# Altium integrated library AnalogDevices.IntLib: 130 symbols (part 1 of 4)
Pins are listed as number, name and electrical type; pins without a type are passive.

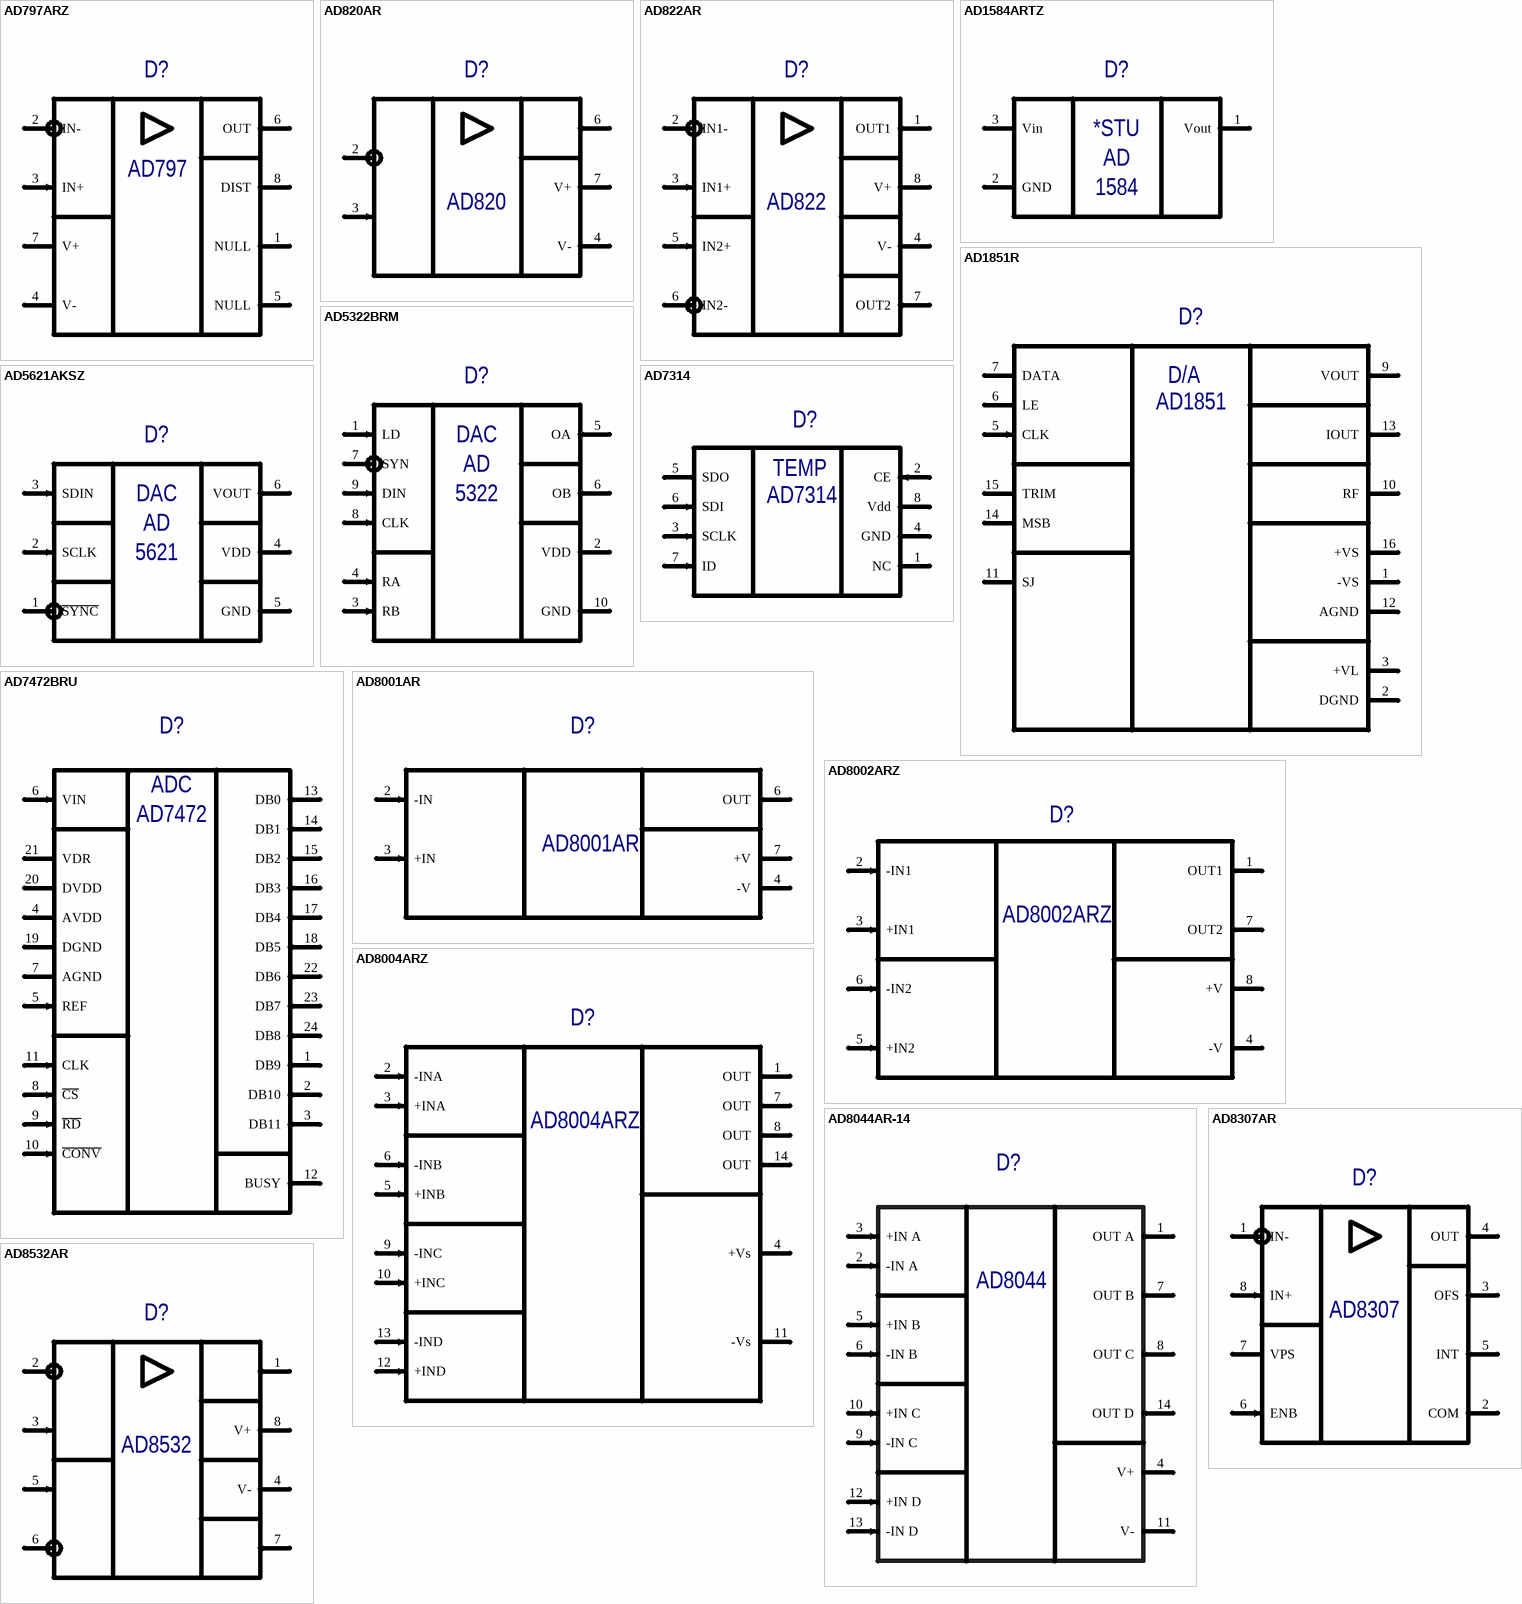
[diagram p0: symbols AD797ARZ to AD8532AR]

## AD797ARZ
designator D?  (value not drawn)
Ultralow Noise Op Amp; Manufacturer: Analog Devices; Type: Микросхема; BCPId: *; Name: *; Package: R-8; ManufacturerPartNumber: AD797ARZ
footprint SOIC127P600-8M (SOIC, 8-Leads, Body 4.9x3.9mm, Pitch 1.27mm, IPC Low Density)
pins: 1 NULL (power) "OFFSET NULL", 2 IN- (in) "IN1-", 3 IN+ (in) "IN1+", 4 V- (power) "0V power pin", 5 NULL (power) "OFFSET NULL", 6 OUT (out) "OUT2", 7 V+ (power) "5 V to 30 V power pin", 8 DIST (power) "OFFSET NULL"
text: AD797

## AD820AR
designator D?  (value not drawn)
Single Supply, Rail-to-Rail Low Power FET-Input Op Amp; Manufacturer: Analog Devices; Type: Микросхема; SymAuthor: Ерешко П.А.; BCPId: *; Name: *; Package: R-8; ManufacturerPartNumber: AD820AR
footprint SOIC127P600-8M (SOIC, 8-Leads, Body 4.9x3.9mm, Pitch 1.27mm, IPC Low Density)
pins: 2 IN- (in), 3 IN+ (in), 4 V- (power) "0V power pin", 6 OUT (out), 7 V+ (power) "5 V to 30 V power pin"
text: AD820

## AD822AR
designator D?  (value not drawn)
Single Supply, Rail-to-Rail Low Power FET-Input Op Amp; Manufacturer: Analog Devices; Type: Микросхема; BCPId: *; Name: *; Package: R-8; ManufacturerPartNumber: AD822AR
footprint SOIC127P600-8M (SOIC, 8-Leads, Body 4.9x3.9mm, Pitch 1.27mm, IPC Low Density)
pins: 1 OUT1 (out), 2 IN1- (in), 3 IN1+ (in), 4 V- (power) "0V power pin", 5 IN2+ (in), 6 IN2- (in), 7 OUT2 (out), 8 V+ (power) "5 V to 30 V power pin"
text: AD822

## AD1584ARTZ
designator D?  (value not drawn)
4.096 V Micropower, Precision Series Mode Voltage Reference; Manufacturer: Analog Devices; Type: Микросхема; BCPId: *; Name: *; Package: SOT-23-3; ManufacturerPartNumber: AD1584ARTZ
footprint SOT23-3L (SOT23, 3-Leads, Body 2.9x1.3mm, Pitch 0.95mm, Lead Span 2.5mm, IPC High Density)
footprint SOT23-3M (SOT23, 3-Leads, Body 2.9x1.3mm, Pitch 0.95mm, Lead Span 2.5mm, IPC Low Density)
footprint SOT23-3N (SOT23, 3-Leads, Body 2.9x1.3mm, Pitch 0.95mm, Lead Span 2.5mm, IPC Medium Density)
pins: 1 Vout (power) "Output", 2 GND (power) "Ground", 3 Vin (power) "Input"
text: *STU; AD; 1584

## AD1851R
designator D?  (value not drawn)
16-Bit DAC; Manufacturer: Analog Devices; Type: Микросхема; BCPId: *; Name: *; Package: R-16 (16-pin SOIC); ManufacturerPartNumber: AD1851R
footprint SOIC127P1030X265-16N (SOIC, 16-Leads, Body 10,30x7,50mm, Pitch 1,27mm, IPC Medium Density)
pins: 1 -VS (power) "Analog Negative Power Supply", 2 DGND (power) "Logic Ground", 3 +VL (power) "Logic Positive Power Supply", 4 NC hidden, 5 CLK (in) "Clock Input", 6 LE "Latch Enable Input", 7 DATA "Serial Data Input", 8 NC hidden, 9 VOUT (out) "Voltage Output", 10 RF "Feedback Resistor", 11 SJ "Summing Junction", 12 AGND (power) "Analog Ground", 13 IOUT (out) "Current Output", 14 MSB "MSB Adjustment Terminal", 15 TRIM "MSB Trimming Potentiometer Terminal", 16 +VS (power) "Analog Positive Power Supply"
text: D/A; AD1851

## AD5322BRM
designator D?  (value not drawn)
12-Bit DAC; Manufacturer: Analog Devices; Type: Микросхема; BCPId: *; Name: *; Package: RM-10; ManufacturerPartNumber: AD5322BRM
footprint TSSOP50P490X110-10N (TSSOP, 10-Leads, Body 3,0x3,0mm (max), Pitch 0,50mm, IPC Medium Density)
pins: 1 LD (in) "Active Low Control Input.", 2 VDD (power) "Power Supply Input from 2.5 V to 5.5 V", 3 RB (in) "Reference Input Pin for DAC B", 4 RA (in) "Reference Input Pin for DAC A", 5 OA (out) "Buffered Analog Output Voltage from DAC A", 6 OB (out) "Buffered Analog Output Voltage from DAC B", 7 SYN (in) "Active Low Control Input", 8 CLK (in) "Serial Clock Input", 9 DIN (in) "Serial Data Input", 10 GND (power) "Ground Reference Point for All Circuitry on the Part"
text: DAC; AD; 5322

## AD5621AKSZ
designator D?  (value not drawn)
12-Bit DAC; Manufacturer: Analog Devices; Type: Микросхема; SymAuthor: Ерешко П.А.; BCPId: *; Name: *; Package: KS-6; ManufacturerPartNumber: AD5621AKSZ
footprint SC70-6 (6-Lead Plastic SC70)
pins: 1 ~{SYNС} (in) "Active Low Control Input", 2 SCLK (in) "Serial Clock Input", 3 SDIN (in) "Serial Data Input", 4 VDD (power) "Power Supply Input from 2.7 V to 5.5 V", 5 GND (power) "Ground", 6 VOUT (out) "Analog Output Voltage from the DAC"
text: DAC; AD; 5621

## AD7314
designator D?  (value not drawn)
Low Voltage, 10-Bit Digital Temperature  Sensor in 8-Lead MSOP; Manufacturer: Analog Devices; ManufacturerPartNumber: AD7314ARMZ; Type: Микросхема; SymAuthor: Календарова В.; BCPId: *; Package: RM-8; TU/GOST: *
footprint TSOP65P490X110-8N (Shrink Small Outline; 8 Leads; Body Width 3 mm; Pitch 0.65 mm)
pins: 1 NC, 2 CE (in), 3 SCLK (in), 4 GND (power), 5 SDO (out), 6 SDI (in), 7 ID (in), 8 Vdd (power)
text: TEMP

## AD7472BRU
designator D?  (value not drawn)
АЦП одноканальный разрядностью 12 бит с параллельным интерфейсом; Manufacturer: Analog Devices; Type: Микросхема; SymAuthor: Семенов В.С.; BCPId: *; ManufacturerPartNumber: AD7472BRU; Package: RU-24
footprint TSOP65P640X120-24N (TSOP, 24-Leads, Body 6,6x4,5mm (max), Pitch 0,65mm, IPC Medium Density)
pins: 1 DB9 (out) "Цифровой выход параллельного интерфейса", 2 DB10 (out) "Цифровой выход параллельного интерфейса", 3 DB11 (out) "Цифровой выход параллельного интерфейса", 4 AVDD (power) "Вход питания аналоговых цепей", 5 REF (in) "Вход для внешнего опорного напряжения", 6 VIN (in) "Аналоговый вход для измеряемого напряжения", 7 AGND (power) "Земля аналоговых цепей", 8 ~{CS} (in) "Инверсный вход, выбор чипа", 9 ~{RD} (in) "Инверсный вход выбора режима чтения", 10 ~{CONV} (in) "Инверсный вход сигнала запуска преобразования", 11 CLK (in) "Вход тактирования параллельного интерфейса", 12 BUSY (out) "Цифровой выход сигнала индикации состояния микросхемы", 13 DB0 (out) "Цифровой выход параллельного интерфейса", 14 DB1 (out) "Цифровой выход параллельного интерфейса", 15 DB2 (out) "Цифровой выход параллельного интерфейса", 16 DB3 (out) "Цифровой выход параллельного интерфейса", 17 DB4 (out) "Цифровой выход параллельного интерфейса", 18 DB5 (out) "Цифровой выход параллельного интерфейса", 19 DGND (power) "Земля цифровых цепей", 20 DVDD (power) "Вход питания цифровых цепей", 21 VDR (power) "Вход питания драйверов цепей параллельного интерфейса", 22 DB6 (out) "Цифровой выход параллельного интерфейса", 23 DB7 (out) "Цифровой выход параллельного интерфейса", 24 DB8 (out) "Цифровой выход параллельного интерфейса"
text: ADC; AD7472

## AD8001AR
designator D?  (value not drawn)
800 MHz, 50 mW  Current Feedback Amplifier; Manufacturer: Analog Devices; Type: Микросхема; BCPId: *; ManufacturerPartNumber: AD8001AR; Package: R-8 (8-Lead SOIC)
footprint SOIC127P600-8M (SOIC, 8-Leads, Body 4.9x3.9mm, Pitch 1.27mm, IPC Low Density)
pins: 1 NC hidden, 2 -IN (in), 3 +IN (in), 4 -V (power), 5 NC hidden, 6 OUT (out), 7 +V (power), 8 NC hidden

## AD8002ARZ
designator D?
Dual 600 MHz, 50 mW  Current Feedback Amplifier; Manufacturer: Analog Devices; ManufacturerPartNumber: AD8002ARZ; Type: Микросхема; BCPId: *; Package: R-8 (8-Lead SOIC)
footprint SOIC127P600-8M (SOIC, 8-Leads, Body 4.9x3.9mm, Pitch 1.27mm, IPC Low Density)
pins: 1 OUT1 (out) "Output 1", 2 -IN1 (in) "Inverting Input 1", 3 +IN1 (in) "Noninverting Input 1", 4 -V (power) "VEE or Negative Supply", 5 +IN2 (in) "Noninverting Input 2", 6 -IN2 (in) "Inverting Input 2", 7 OUT2 (out) "Output 2", 8 +V (power) "VCC or Positive Supply"

## AD8004ARZ
designator D?, comment AD8004ARZ-14  (value not drawn)
Quad 3000 V/ms, 35 mW  Current Feedback Amplifier; Manufacturer: Analog Devices; Type: Микросхема; BCPId: *; Name: *; Package: R-14; ManufacturerPartNumber: AD8004ARZ-14
footprint SOIC127P600X175-14N (SOIC, 14-Leads, Body 8.7x3.9mm, Pitch 1.27mm, IPC Medium Density)
pins: 1 OUT (out), 2 -INA (in), 3 +INA (in), 4 +Vs (power), 5 +INB (in), 6 -INB (in), 7 OUT (out), 8 OUT (out), 9 -INC (in), 10 +INC (in), 11 -Vs (power), 12 +IND (in), 13 -IND (in), 14 OUT (out)

## AD8044AR-14
designator D?
Quad 150 MHz  Rail-to-Rail Amplifier; Manufacturer: Analog Devices; ManufacturerPartNumber: AD8044AR-14; Type: Микросхема; BCPId: *; Package: R-14
footprint SOIC127P600X175-14N (SOIC, 14-Leads, Body 8.7x3.9mm, Pitch 1.27mm, IPC Medium Density)
pins: 1 OUT A (out) "Output A channel", 2 -IN A (in) "Input A channel", 3 +IN A (in) "Input A channel", 4 V+ (power) "Power", 5 +IN B (in) "Input B channel", 6 -IN B (in) "Input B channel", 7 OUT B (out) "Output B channel", 8 OUT C (out) "Output C channel", 9 -IN C (in) "Input C channel", 10 +IN C (in) "Itput C channel", 11 V- (power) "Power", 12 +IN D (in) "Input D channel", 13 -IN D (in) "Input D channel", 14 OUT D (out) "Output D channel"
text: AD8044

## AD8307AR
designator D?  (value not drawn)
Logarithmic Amplifier DC-500 MHz, 92 dB; Manufacturer: Analog Devices; Type: Микросхема; BCPId: *; Name: *; Package: SO-8; ManufacturerPartNumber: AD8307AR
footprint SOIC127P600-8M (SOIC, 8-Leads, Body 4.9x3.9mm, Pitch 1.27mm, IPC Low Density)
pins: 1 IN- (in), 2 COM (power) "Common Pin (Usually Grounded).", 3 OFS (out) "Offset Adjustment; External Capacitor  Connection", 4 OUT (out), 5 INT (out) "Intercept Adjustment", 6 ENB (in) "Chip Enable", 7 VPS (power) "Positive Supply, 2.7V–5.5V.", 8 IN+ (in)
text: AD8307

## AD8532AR
designator D?  (value not drawn)
Low Cost, 250 mA Output Single-Supply Amplifier; Manufacturer: Analog Devices; Type: Микросхема; BCPId: *; Name: *; Package: RN-8; ManufacturerPartNumber: AD8532AR
footprint SOIC127P600-8M (SOIC, 8-Leads, Body 4.9x3.9mm, Pitch 1.27mm, IPC Low Density)
pins: 1 OUTA (out), 2 INA- (in), 3 INA+ (in), 4 V- (power) "0V power pin", 5 INB+ (in), 6 INB- (in), 7 OUTB (out), 8 V+ (power) "+2.7-6.0 V power pin"
text: AD8532

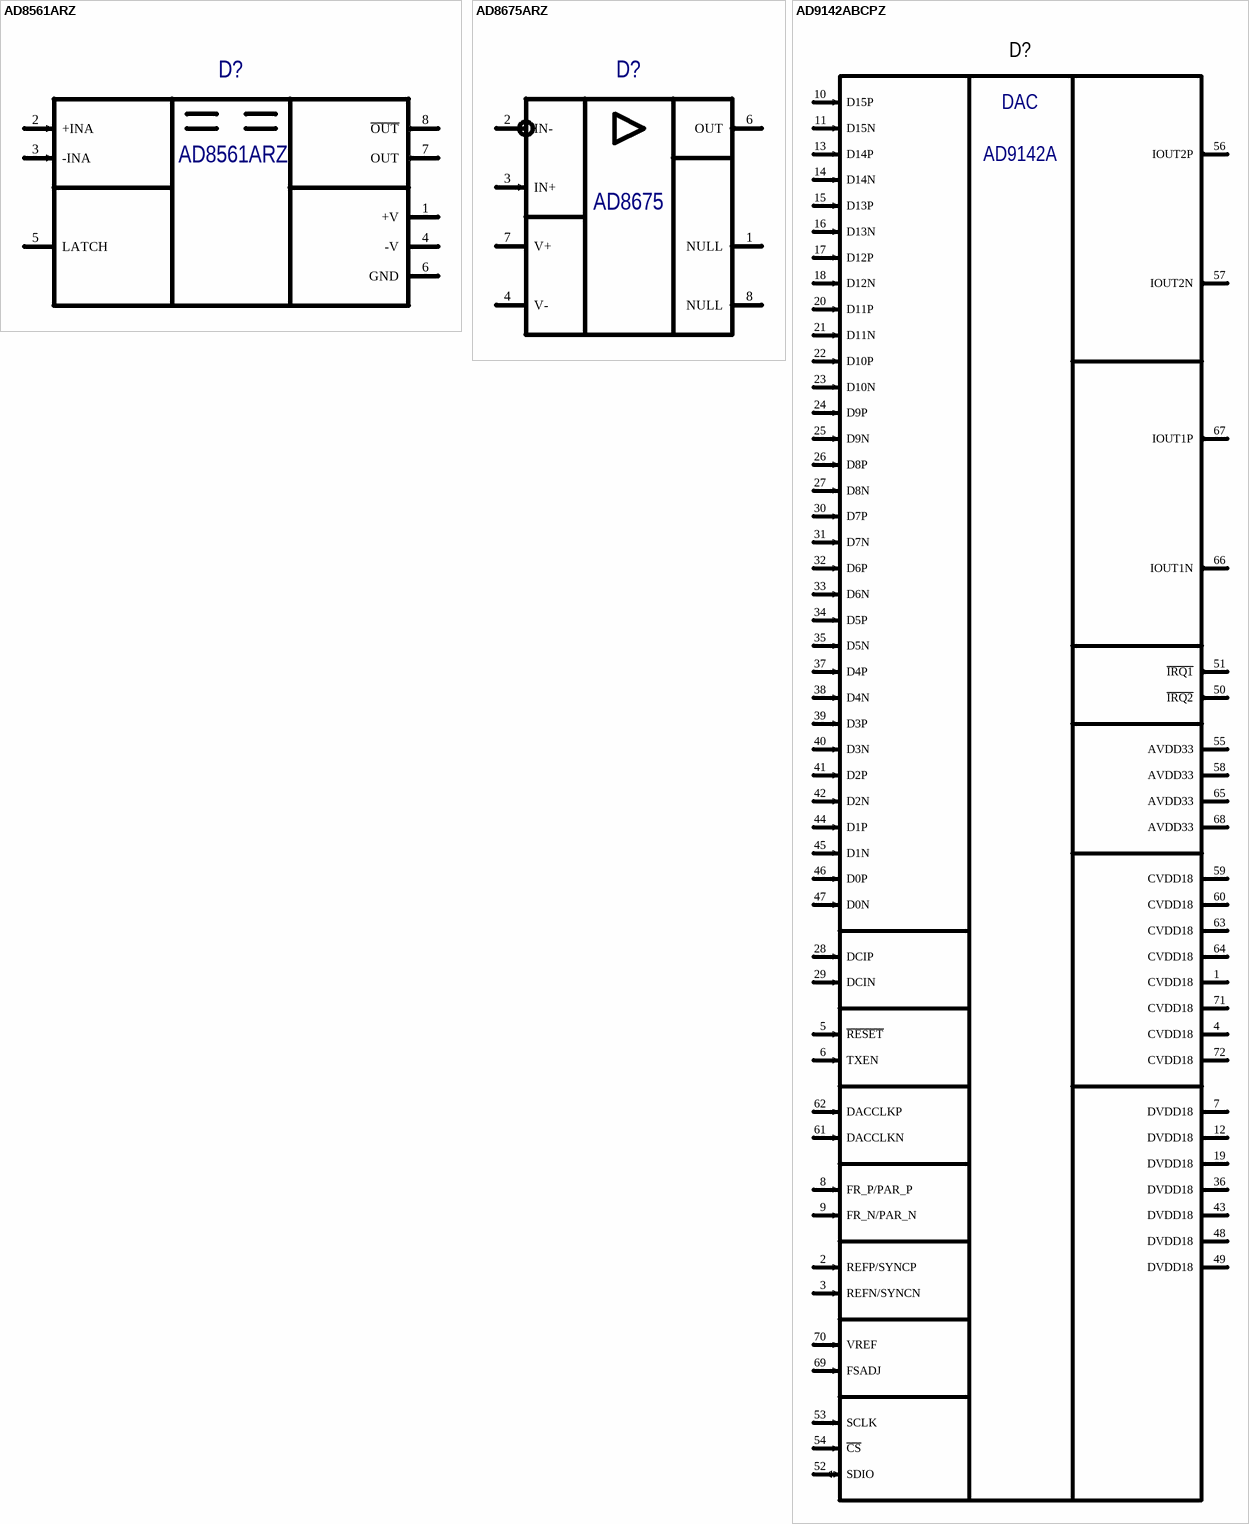
[diagram p1: symbols AD8561ARZ to AD9142ABCPZ]

## AD8561ARZ
designator D?  (value not drawn)
Ultrafast 7 ns  Single Supply Comparator; Manufacturer: Analog Devices; Type: Микросхема; BCPId: *; Name: *; Package: R-8; ManufacturerPartNumber: AD8561ARZ
footprint SOIC127P600-8M (SOIC, 8-Leads, Body 4.9x3.9mm, Pitch 1.27mm, IPC Low Density)
pins: 1 +V (power), 2 +INA (in), 3 -INA (in), 4 -V (power), 5 LATCH, 6 GND (power), 7 OUT (out), 8 ~{OUT} (out)

## AD8675ARZ
designator D?  (value not drawn)
36 V Precision, 2.8 nV/√Hz  Rail-to-Rail Output Op Amp; Manufacturer: Analog Devices; Type: Микросхема; BCPId: *; Name: *; Package: R-8; ManufacturerPartNumber: AD8675ARZ
footprint SOIC127P600-8M (SOIC, 8-Leads, Body 4.9x3.9mm, Pitch 1.27mm, IPC Low Density)
pins: 1 NULL (power) "OUT1", 2 IN- (in) "IN1-", 3 IN+ (in) "IN1+", 4 V- (power) "0V power pin", 6 OUT (out) "OUT2", 7 V+ (power) "5 V to 30 V power pin", 8 NULL (power) "5 V to 30 V power pin"
text: AD8675

## AD9142ABCPZ
designator D?  (value not drawn)
Dual, 16-Bit, 1600 MSPS, TxDAC+ Digital-to-Analog Converter; Manufacturer: Analog Devices; Type: Микросхема; SymAuthor: Семенов В.С.; ManufacturerPartNumber: AD9142ABCPZ; Package: CP-72-7
footprint QFN50P1000X1000X100_HS615-73N (QFN, 72-Leads, Body 10,00x10,00mm, Pitch 0,50mm, Thermal Pad 6,15x6,15mm, IPC Medium Density)
pins: 1 CVDD18 (power) "1.8 V Clock Supply. Supplies clock receivers and clock distribution", 2 REFP/SYNCP (in), 3 REFN/SYNCN (in), 4 CVDD18 (power) "1.8 V Clock Supply. Supplies clock receivers and clock distribution", 5 ~{RESET} (in), 6 TXEN (in), 7 DVDD18 (power) "1.8 V Digital Supply", 8 FR_P/PAR_P (in) "Frame/Parity Input", 9 FR_N/PAR_N (in) "Frame/Parity Input", 10 D15P (in) "Data input", 11 D15N (in) "Data input", 12 DVDD18 (power) "1.8 V Digital Supply", 13 D14P (in) "Data input", 14 D14N (in) "Data input", 15 D13P (in) "Data input", 16 D13N (in) "Data input", 17 D12P (in) "Data input", 18 D12N (in) "Data input", 19 DVDD18 (power) "1.8 V Digital Supply", 20 D11P (in) "Data input", 21 D11N (in) "Data input", 22 D10P (in) "Data input", 23 D10N (in) "Data input", 24 D9P (in) "Data input", 25 D9N (in) "Data input", 26 D8P (in) "Data input", 27 D8N (in) "Data input", 28 DCIP (in) "Data Clock Input", 29 DCIN (in) "Data Clock Input", 30 D7P (in) "Data input", 31 D7N (in) "Data input", 32 D6P (in) "Data input", 33 D6N (in) "Data input", 34 D5P (in) "Data input", 35 D5N (in) "Data input", 36 DVDD18 (power) "1.8 V Digital Supply", 37 D4P (in) "Data input", 38 D4N (in) "Data input", 39 D3P (in) "Data input", 40 D3N (in) "Data input", 41 D2P (in) "Data input", 42 D2N (in) "Data input", 43 DVDD18 (power) "1.8 V Digital Supply", 44 D1P (in) "Data input", 45 D1N (in) "Data input", 46 D0P (in) "Data input", 47 D0N (in) "Data input", 48 DVDD18 (power) "1.8 V Digital Supply", 49 DVDD18 (power) "1.8 V Digital Supply", 50 ~{IRQ2} (out), 51 ~{IRQ1} (out), 52 SDIO (io), 53 SCLK (in), 54 ~{CS} (in) "Serial Port Chip Select", 55 AVDD33 (power) "3.3 V Analog Supply", 56 IOUT2P (out), 57 IOUT2N (out), 58 AVDD33 (power) "3.3 V Analog Supply", 59 CVDD18 (power) "1.8 V Clock Supply. Supplies clock receivers and clock distribution", 60 CVDD18 (power) "1.8 V Clock Supply. Supplies clock receivers and clock distribution", 61 DACCLKN (in) "DAC Clock Input", 62 DACCLKP (in) "DAC Clock Input", 63 CVDD18 (power) "1.8 V Clock Supply. Supplies clock receivers and clock distribution", 64 CVDD18 (power) "1.8 V Clock Supply. Supplies clock receivers and clock distribution", 65 AVDD33 (power) "3.3 V Analog Supply", 66 IOUT1N (out), 67 IOUT1P (out), 68 AVDD33 (power) "3.3 V Analog Supply", 69 FSADJ (in), 70 VREF (in), 71 CVDD18 (power) "1.8 V Clock Supply. Supplies clock receivers and clock distribution", 72 CVDD18 (power) "1.8 V Clock Supply. Supplies clock receivers and clock distribution", EPAD (power) hidden to GND "Exposed Pad"
text: DAC; AD9142A

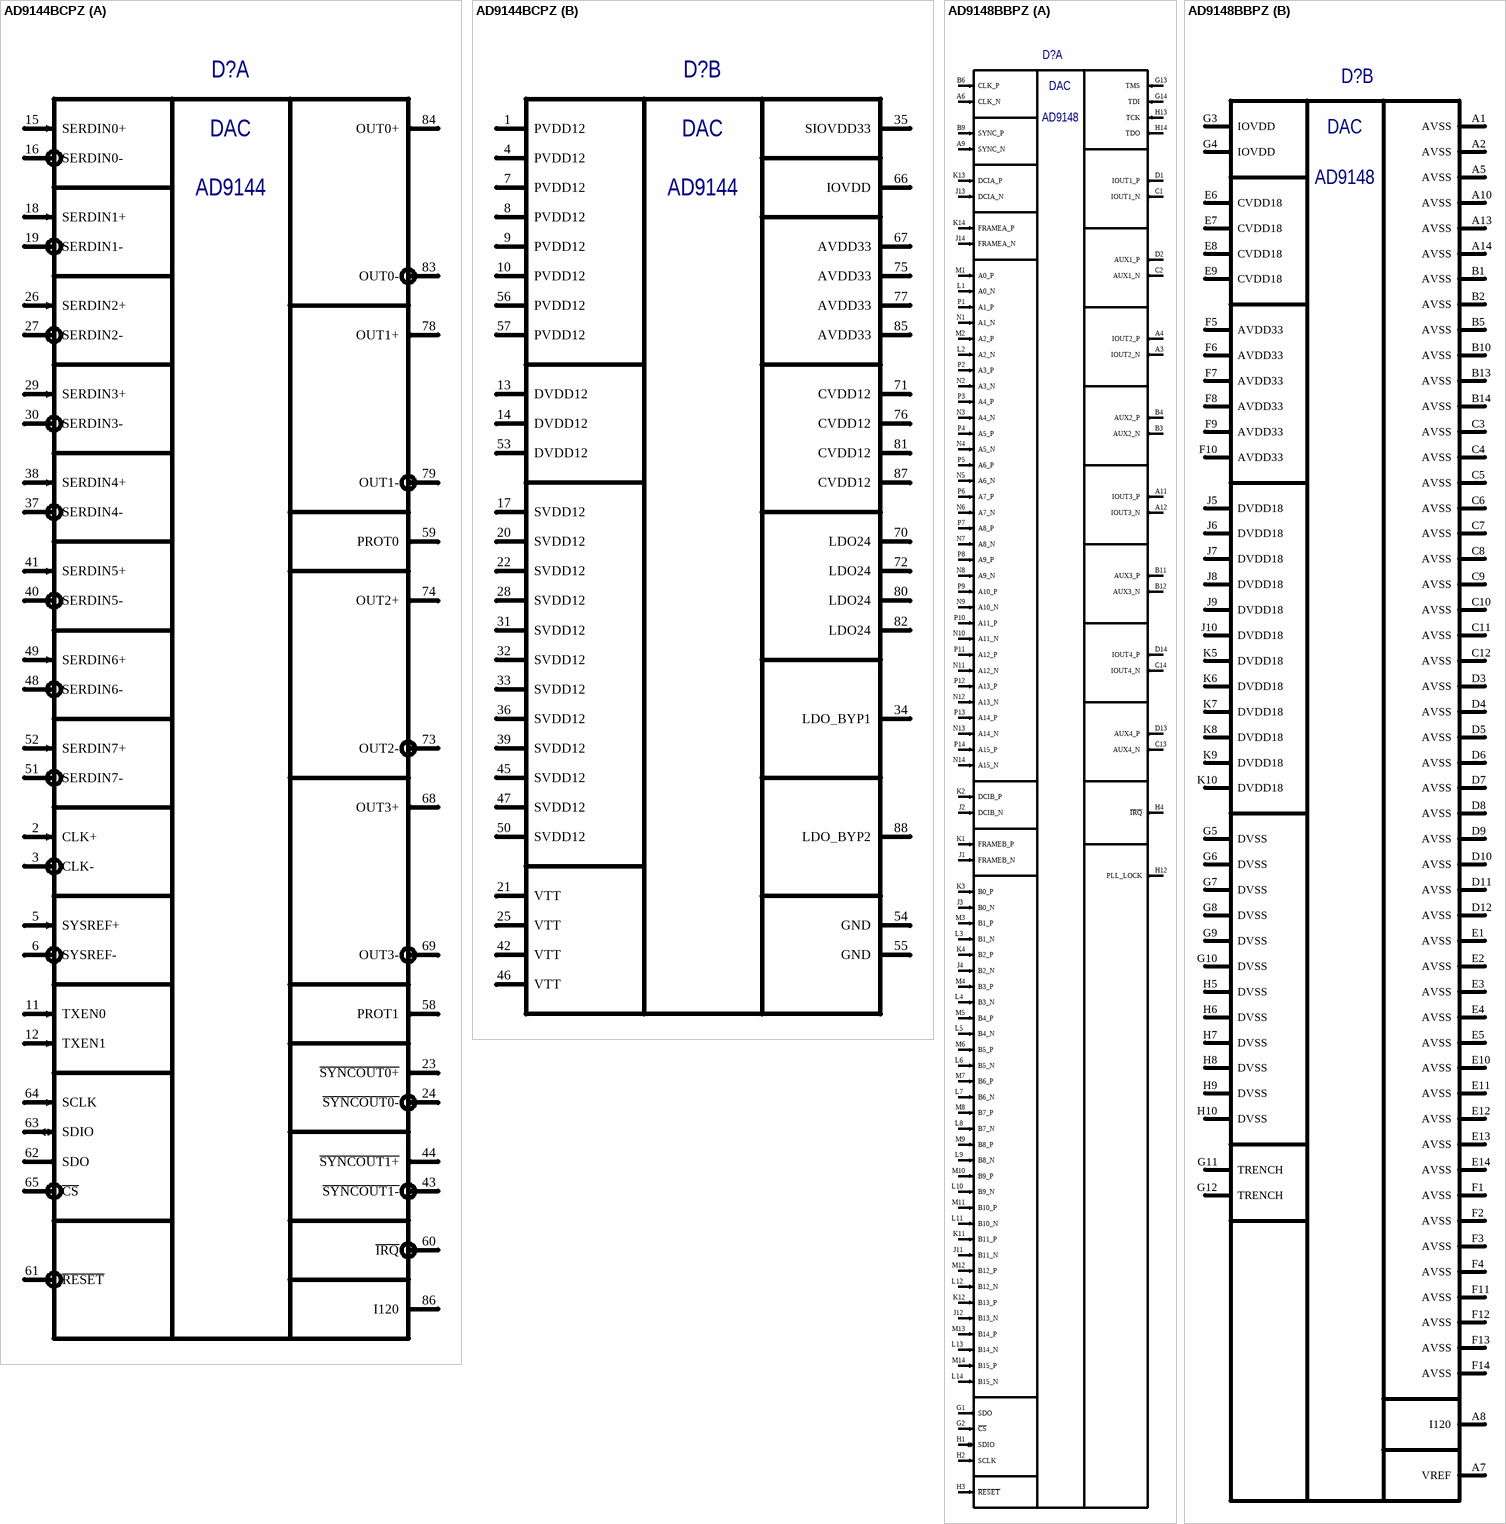
[diagram p2: symbols AD9144BCPZ to AD9148BBPZ]

## AD9144BCPZ
designator D?  (value not drawn)
Quad, 16-Bit, 2.8 GSPS, TxDAC; Manufacturer: Analog Devices; Type: Микросхема; SymAuthor: Ерешко П.А.; Package: CP-88-6; ManufacturerPartNumber: AD9144BCPZ
footprint QFN50P1200X1200X90_HS-89N (QFN, 88-Leads, Body 12,00x12,00mm, Pitch 0,50mm, Thermal Pad 7,40x7,40mm, IPC Medium Density)
part A pins: 2 CLK+ (in) "PLL Reference/Clock Positive Input", 3 CLK- (in) "PLL Reference/Clock Negative Input", 5 SYSREF+ (in) "Positive Reference Clock for Deterministic Latency", 6 SYSREF- (in) "Negative Reference Clock for Deterministic Latency", 11 TXEN0 (in) "Transmit Enable for DAC0 and DAC1", 12 TXEN1 (in) "Transmit Enable for DAC2 and DAC3", 15 SERDIN0+ (in) "Serial Channel Positive Input 0. CML compliant", 16 SERDIN0- (in) "Serial Channel Negative Input 0. CML compliant", 18 SERDIN1+ (in) "Serial Channel Positive Input 1. CML compliant", 19 SERDIN1- (in) "Serial Channel Negative Input 1. CML compliant", 23 ~{SYNCOUT0+} (out) "Positive LVDS Sync Output Signal Channel Link 0", 24 ~{SYNCOUT0-} (out) "Negative LVDS Sync Output Signal Channel Link 0", 26 SERDIN2+ (in) "Serial Channel Positive Input 2. CML compliant", 27 SERDIN2- (in) "Serial Channel Negative Input 2. CML compliant", 29 SERDIN3+ (in) "Serial Channel Positive Input 3. CML compliant", 30 SERDIN3- (in) "Serial Channel Negative Input 3. CML compliant", 37 SERDIN4- (in) "Serial Channel Negative Input 4. CML compliant", 38 SERDIN4+ (in) "Serial Channel Positive Input 4. CML compliant", 40 SERDIN5- (in) "Serial Channel Negative Input 5. CML compliant", 41 SERDIN5+ (in) "Serial Channel Positive Input 5. CML compliant", 43 ~{SYNCOUT1-} (out) "Negative LVDS Sync Output Signal Channel Link 1", 44 ~{SYNCOUT1+} (out) "Positive LVDS Sync Output Signal Channel Link 1", 48 SERDIN6- (in) "Serial Channel Negative Input 6. CML compliant", 49 SERDIN6+ (in) "Serial Channel Positive Input 6. CML compliant", 51 SERDIN7- (in) "Serial Channel Negative Input 7. CML compliant", 52 SERDIN7+ (in) "Serial Channel Positive Input 7. CML compliant", 58 PROT1 (out) "Power Detection Protection", 59 PROT0 (out) "Power Detection Protection", 60 ~{IRQ} (out) "Interrupt Request", 61 ~{RESET} (in) "Reset. This pin is active low", 62 SDO (out) "Serial Port Data Output", 63 SDIO (io) "Serial Port Data Input/Output", 64 SCLK (in) "Serial Port Clock Input", 65 ~{CS} (in) "Serial Port Chip Select", 68 OUT3+ (out) "DAC3 Positive Current Output", 69 OUT3- (out) "DAC3 Negative Current Output", 73 OUT2- (out) "DAC2 Negative Current Output", 74 OUT2+ (out) "DAC2 Positive Current Output", 78 OUT1+ (out) "DAC1 Positive Current Output.", 79 OUT1- (out) "DAC1 Negative Current Output.", 83 OUT0- (out) "DAC0 Negative Current Output", 84 OUT0+ (out) "DAC0 Positive Current Output", 86 I120 "Output Current Generation Pin for DAC Full-Scale Current", EPAD (power) hidden to GND "Exposed Pad. Connect to GND"
part B pins: 1 PVDD12 (power) "1.2V Supply", 4 PVDD12 (power) "1.2 V Supply. PVDD12 provides a clean supply", 7 PVDD12 (power) "1.2 V Supply. PVDD12 provides a clean supply", 8 PVDD12 (power) "1.2 V Supply. PVDD12 provides a clean supply", 9 PVDD12 (power) "1.2 V Supply. PVDD12 provides a clean supply", 10 PVDD12 (power) "1.2 V Supply. PVDD12 provides a clean supply", 13 DVDD12 (power) "1.2 V Digital Supply", 14 DVDD12 (power) "1.2 V Digital Supply", 17 SVDD12 (power) "1.2 V JESD204B Receiver Supply", 20 SVDD12 (power) "1.2 V JESD204B Receiver Supply", 21 VTT (power) "1.2 V Termination Voltage", 22 SVDD12 (power) "1.2 V JESD204B Receiver Supply", 25 VTT (power) "1.2 V Termination Voltage", 28 SVDD12 (power) "1.2 V JESD204B Receiver Supply", 31 SVDD12 (power) "1.2 V JESD204B Receiver Supply.", 32 SVDD12 (power) "1.2 V JESD204B Receiver Supply.", 33 SVDD12 (power) "1.2 V JESD204B Receiver Supply.", 34 LDO_BYP1 "LDO SERDES Bypass", 35 SIOVDD33 (power) "3.3 V Supply for SERDES", 36 SVDD12 (power) "1.2 V JESD204B Receiver Supply", 39 SVDD12 (power) "1.2 V JESD204B Receiver Supply", 42 VTT (power) "1.2 V Termination Voltage", 45 SVDD12 (power) "1.2 V JESD204B Receiver Supply", 46 VTT (power) "1.2 V Termination Voltage", 47 SVDD12 (power) "1.2 V JESD204B Receiver Supply", 50 SVDD12 (power) "1.2 V JESD204B Receiver Supply", 53 DVDD12 (power) "1.2 V Digital Supply", 54 GND (power) "Ground", 55 GND (power) "Ground", 56 PVDD12 (power) "1.2 V Supply", 57 PVDD12 (power) "1.2 V Supply", 66 IOVDD (power) "IOVDD Supply for CMOS Input/Output and SPI", 67 AVDD33 (power) "3.3 V Analog Supply for DAC Cores", 70 LDO24 "2.4 V LDO", 71 CVDD12 "1.2 V Clock Supply. Place bypass capacitors as near as possible to Pin 71", 72 LDO24 "2.4 V LDO", 75 AVDD33 (power) "3.3 V Analog Supply for DAC Cores.", 76 CVDD12 "1.2 V Clock Supply. Place bypass capacitors as near as possible to Pin 76", 77 AVDD33 (power) "3.3 V Analog Supply for DAC Cores.", 80 LDO24 "2.4 V LDO", 81 CVDD12 "1.2 V Clock Supply. Place bypass capacitors as near as possible to Pin 81", 82 LDO24 "2.4 V LDO", 85 AVDD33 (power) "3.3 V Analog Supply for DAC Cores", 87 CVDD12 "1.2 V Clock Supply", 88 LDO_BYP2 "LDO Clock Bypass for DAC PLL"
part A text: DAC; AD9144
part B text: DAC; AD9144

## AD9148BBPZ
designator D?  (value not drawn)
Quad 16-Bit,1 GSPS digital-to analog converter (DAC).; Manufacturer: Analog Devices; Type: Микросхема; SymAuthor: Антонов М.С.; BCPId: *; HelpURL: *; ManufacturerPartNumber: AD9148BBPZ; Name: *; Package: BP-196-1; Price: *; Rem: *; TU/GOST: *
footprint BGA196C80P14X14_1200X1200X150 (BGA, 196-Leads, Body 12,00x12,00mmx1,50mm, Pitch 0,80mm)
part A pins:  L1 A0_N (in) "LVDS Data Input Pair, Port A.",  L2 A2_N (in) "LVDS Data Input Pair, Port A.", A3  IOUT2_N  (out) "DAC 2 Complementary Output Current.", A4  IOUT2_P  (out) "DAC 2 Positive Output Current.", A6 CLK_N (in) "Positive/Negative DAC Clock Input (CLK).", A9 SYNC_N (in) "PLL Reference Clock Input (REFCLK_x). This pin has a secondary function as", A11 IOUT3_P  (out) "DAC 3 Complementary Output Current.", A12 IOUT3_N  (out) "DAC 3 Positive Output Current.", B3  AUX2_N  (out) "Auxiliary DAC 2 Complementary Output Current.", B4  AUX2_P  (out) "Auxiliary DAC 2 Positive Output Current.", B6 CLK_P (in) "Positive/Negative DAC Clock Input (CLK).", B9 SYNC_P (in) "PLL Reference Clock Input (REFCLK_x). This pin has a secondary function as", B11  AUX3_P  (out) "Auxiliary DAC 3 Positive Output Current.", B12  AUX3_N  (out) "Auxiliary DAC 3 Complementary Output Current.", C1 IOUT1_N  (out) "DAC 1 Complementary Output Current.", C2  AUX1_N  (out) "Auxiliary DAC 1 Complementary Output Current.", C13  AUX4_N  (out) "Auxiliary DAC 4 Complementary Output Current.", C14  IOUT4_N  (out) "DAC 4 Complementary Output Current.", D1 IOUT1_P  (out) "DAC 1 Positive Output Current.", D2  AUX1_P  (out) "Auxiliary DAC 1 Positive Output Current.", D13  AUX4_P  (out) "Auxiliary DAC 4 Positive Output Current.", D14  IOUT4_P  (out) "DAC 4 Positive Output Current.", G1 SDO  (out) "Serial Data Output for SPI.", G2 ~{CS} (in) "Active Low Chip Select for SPI.", G13  TMS  (in) "Reserved for Future Use. Connect to DVSS.", G14  TDI  (in) "Reserved for Future Use. Connect to DVSS.", H1 SDIO  (io) "Serial Data Input/Output for SPI.", H2 SCLK  (in) "Qualifying Clock Input for SPI.", H3 ~{RESET} (in) "An active low LVCMOS input resets the device. Pull up to IOVDD.", H4 ~{IRQ} (out) "Active Low Open-Drain Interrupt Request Output. Pull up to IOVDD with   a 10 kΩresistor", H12 PLL_LOCK (out) "Active High LVCMOS Output. It indicates the lock status of the PLL circuitry.", H13  TCK  (in) "Reserved for Future Use. Connect to DVSS.", H14  TDO  (out) "Reserved for Future Use. Leave unconnected.", J1 FRAMEB_N (in) "LVDS Frame Input for Port B. Tie to LVDS logic low if not used.", J2 DCIB_N (in) "LVDS Data Clock Input Pair for Port B.", J3  B0_N  (in) "LVDS Data Input Pair, Port A.", J4  B2_N  (in) "LVDS Data Input Pair, Port A.", J11  B11_N (in) "LVDS Data Input Pair, Port A.", J12  B13_N (in) "LVDS Data Input Pair, Port A.", J13 DCIA_N  (in) "LVDS Data Clock Input Pair for Port A.", J14 FRAMEA_N (in) "LVDS Frame Input for Port A. Tie to LVDS logic low if not used.", K1 FRAMEB_P (in) "LVDS Frame Input for Port B. Tie to LVDS logic low if not used.", K2 DCIB_P (in) "LVDS Data Clock Input Pair for Port B.", K3 B0_P (in) "LVDS Data Input Pair, Port A.", K4 B2_P (in) "LVDS Data Input Pair, Port A.", K11 B11_P (in) "LVDS Data Input Pair, Port A.", K12 B13_P (in) "LVDS Data Input Pair, Port A.", K13 DCIA_P (in) "LVDS Data Clock Input Pair for Port A.", K14 FRAMEA_P  (in) "LVDS Frame Input for Port A. Tie to LVDS logic low if not used.", L3  B1_N  (in) "LVDS Data Input Pair, Port A.", L4  B3_N  (in) "LVDS Data Input Pair, Port A.", L5  B4_N  (in) "LVDS Data Input Pair, Port A.", L6  B5_N  (in) "LVDS Data Input Pair, Port A.", L7  B6_N (in) "LVDS Data Input Pair, Port A.", L8  B7_N (in) "LVDS Data Input Pair, Port A.", L9  B8_N (in) "LVDS Data Input Pair, Port A.", L10  B9_N (in) "LVDS Data Input Pair, Port A.", L11  B10_N (in) "LVDS Data Input Pair, Port A.", L12  B12_N (in) "LVDS Data Input Pair, Port A.", L13  B14_N (in) "LVDS Data Input Pair, Port A.", L14  B15_N (in) "LVDS Data Input Pair, Port A.", M1 A0_P (in) "LVDS Data Input Pair, Port A.", M2 A2_P (in) "LVDS Data Input Pair, Port A.", M3 B1_P (in) "LVDS Data Input Pair, Port A.", M4 B3_P (in) "LVDS Data Input Pair, Port A.", M5 B4_P (in) "LVDS Data Input Pair, Port A.", M6 B5_P (in) "LVDS Data Input Pair, Port A.", M7 B6_P (in) "LVDS Data Input Pair, Port A.", M8 B7_P (in) "LVDS Data Input Pair, Port A.", M9 B8_P (in) "LVDS Data Input Pair, Port A.", M10 B9_P (in) "LVDS Data Input Pair, Port A.", M11 B10_P (in) "LVDS Data Input Pair, Port A.", M12 B12_P (in) "LVDS Data Input Pair, Port A.", M13 B14_P (in) "LVDS Data Input Pair, Port A.", M14 B15_P (in) "LVDS Data Input Pair, Port A.", N1 A1_N (in) "LVDS Data Input Pair, Port A.", N2 A3_N (in) "LVDS Data Input Pair, Port A.", N3 A4_N (in) "LVDS Data Input Pair, Port A.", N4 A5_N (in) "LVDS Data Input Pair, Port A.", N5 A6_N (in) "LVDS Data Input Pair, Port A.", N6 A7_N (in) "LVDS Data Input Pair, Port A.", N7 A8_N (in) "LVDS Data Input Pair, Port A.", N8 A9_N (in) "LVDS Data Input Pair, Port A.", N9 A10_N (in) "LVDS Data Input Pair, Port A.", N10 A11_N (in) "LVDS Data Input Pair, Port A.", N11 A12_N (in) "LVDS Data Input Pair, Port A.", N12 A13_N (in) "LVDS Data Input Pair, Port A.", N13 A14_N (in) "LVDS Data Input Pair, Port A.", N14 A15_N (in) "LVDS Data Input Pair, Port A.", P1 A1_P (in) "LVDS Data Input Pair, Port A.", P2 A3_P (in) "LVDS Data Input Pair, Port A.", P3 A4_P (in) "LVDS Data Input Pair, Port A.", P4 A5_P (in) "LVDS Data Input Pair, Port A.", P5 A6_P (in) "LVDS Data Input Pair, Port A.", P6 A7_P (in) "LVDS Data Input Pair, Port A.", P7 A8_P (in) "LVDS Data Input Pair, Port A.", P8 A9_P (in) "LVDS Data Input Pair, Port A.", P9 A10_P (in) "LVDS Data Input Pair, Port A.", P10 A11_P (in) "LVDS Data Input Pair, Port A.", P11 A12_P (in) "LVDS Data Input Pair, Port A.", P12 A13_P (in) "LVDS Data Input Pair, Port A.", P13 A14_P (in) "LVDS Data Input Pair, Port A.", P14 A15_P (in) "LVDS Data Input Pair, Port A."